# Altium footprint library UWRT Footprint Library.PcbLib: 258 footprints (part 16 of 17)
Each footprint in its own frame and in the unit in brackets; x right, y up, seen from the top. Pads: shape width x height; smd on the part's side, far side on the other; paste and mask are expansions set on the pad; w line width, h text height; cw(c..) or ccw(c..) is an arc to the next point about the centre after c.
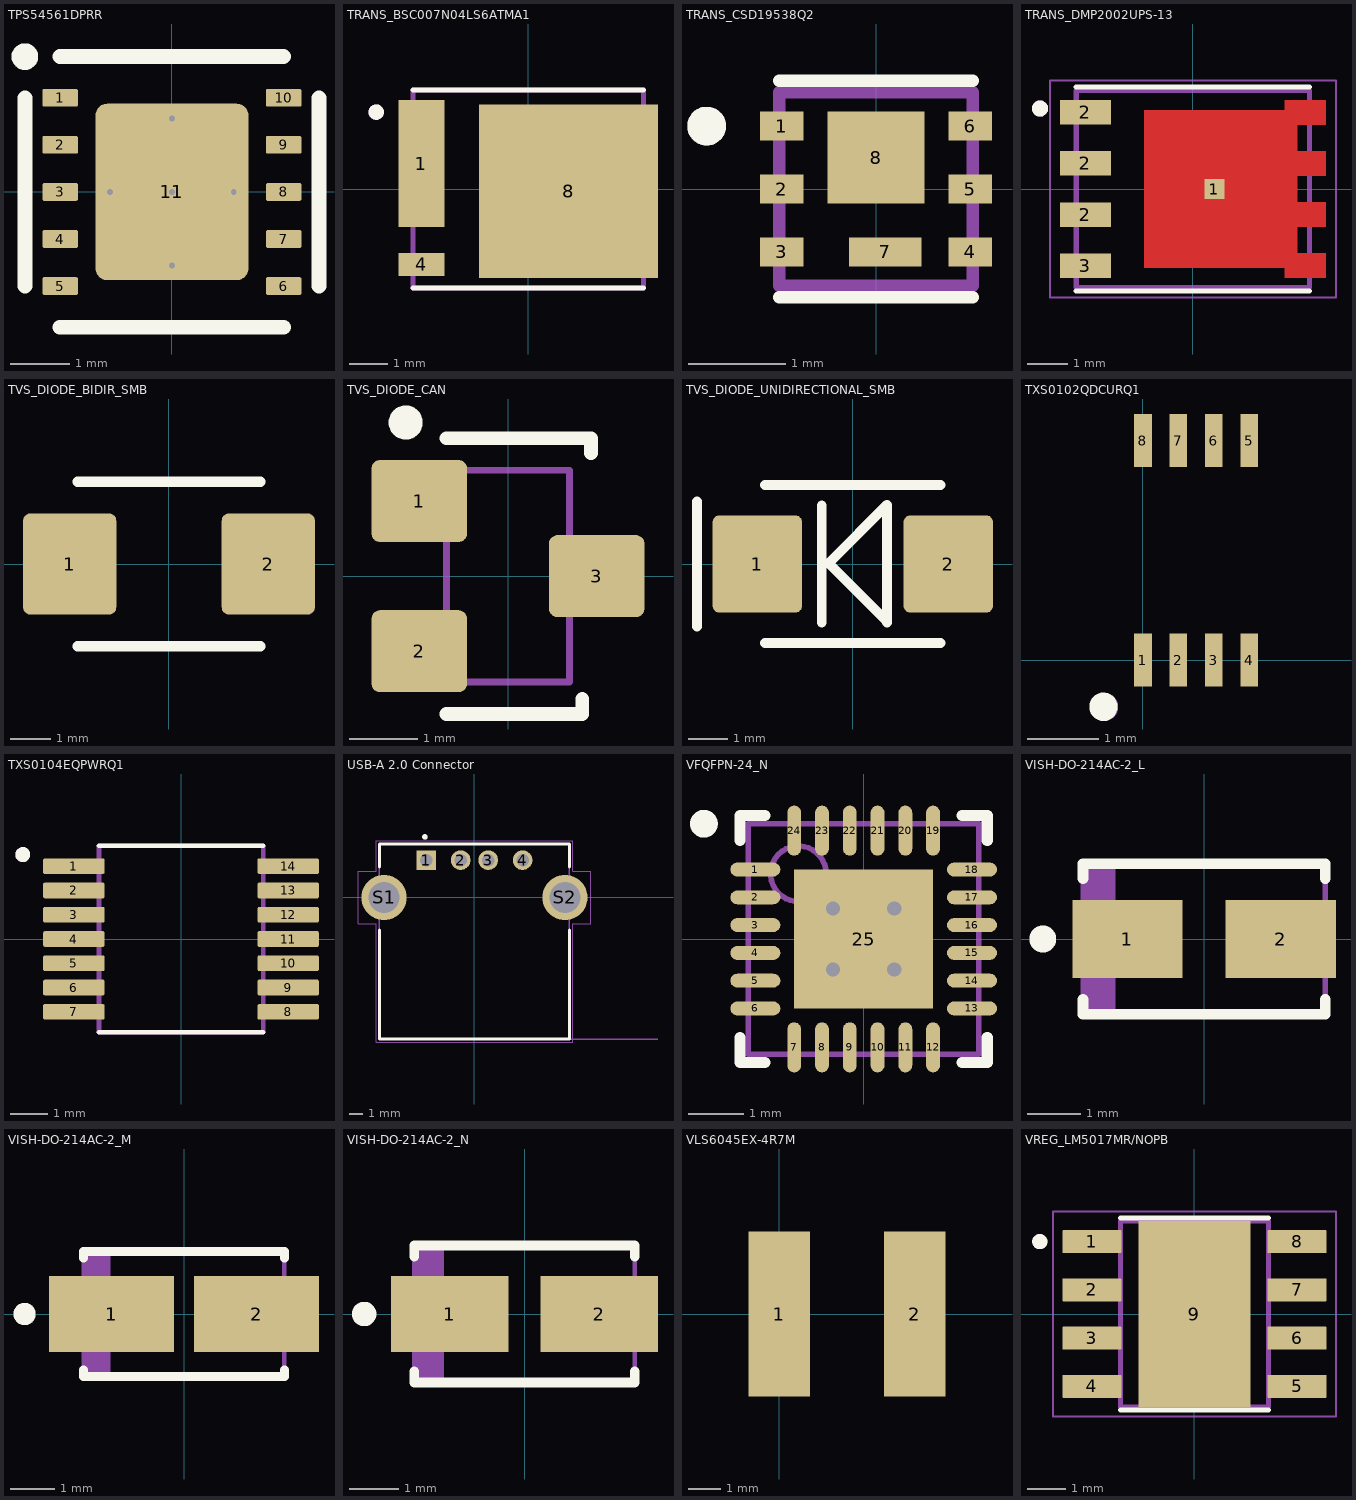
[diagram p15: the footprints below, top view; thin cyan lines are the x and y axes]

## TPS54561DPRR [mm] "Buck Converter"
pads (11):
  rrect15% 0.6x0.3 smd: 1(-1.9,1.6) 2(-1.9,0.8) 3(-1.9,0) 4(-1.9,-0.8) 5(-1.9,-1.6) 6(1.9,-1.6) 7(1.9,-0.8) 8(1.9,0) 9(1.9,0.8) 10(1.9,1.6)
  rrect15% 2.6x3 smd: 11(0,0)
via -1.05,0 diameter 0.2 hole 0.1
via 1.05,0 diameter 0.2 hole 0.1
via 0,-1.25 diameter 0.2 hole 0.1
via 0,1.25 diameter 0.2 hole 0.1
via 0,0 diameter 0.2 hole 0.1
Top Overlay:
  circle w0.254: c-2.5,2.3 r0.1
  lines w0.254: -2.5,-1.6 -2.5,1.6 ; -1.9,-2.3 1.9,-2.3 ; -1.9,2.3 1.9,2.3 ; 2.5,-1.6 2.5,1.6
3D body "TPS54561DPRR.STEP": height 0.8, standoff 0, extent -2,-2 2,2

## TRANS_BSC007N04LS6ATMA1 [mm]
pads (3):
  rect 1.2x3.3 smd paste-3 mask+0: 1(-2.775,0.66)
  rect 1.2x0.6 smd paste-2 mask+0: 4(-2.775,-1.96)
  rect 4.65x4.51 smd paste-3 mask+0: 8(1.05,-0.055)
Top Overlay:
  circle w0.2: c-3.95,2 r0.1
  lines w0.127: -3,-2.575 3,-2.575 ; -3,2.575 3,2.575
Top Paste:
  region: -2.27,-2.163 -2.72,-2.163 -2.72,-1.76 -2.27,-1.76
  region: -2.92,-2.167 -3.27,-2.167 -3.27,-1.76 -2.92,-1.76
  region: -2.92,1.657 -3.27,1.657 -3.27,2.05 -2.92,2.05
  region: -2.92,0.381 -3.27,0.381 -3.27,0.78 -2.92,0.78
  region: -2.92,-0.893 -3.27,-0.893 -3.27,-0.49 -2.92,-0.49
  region: -2.27,-0.891 -2.72,-0.891 -2.72,0.01 -2.27,0.01
  region: -2.27,1.316 -2.72,1.316 -2.72,2.21 -2.27,2.21
  region: -2.27,0.211 -2.72,0.211 -2.72,1.11 -2.27,1.11
  region: 0.55,0.045 -0.95,0.045 -0.95,1.545 0.55,1.545
  region: 2.25,0.045 0.75,0.045 0.75,1.545 2.25,1.545
  region: 0.55,-1.662 -0.95,-1.662 -0.95,-0.155 0.55,-0.155
  region: 2.25,-1.661 0.75,-1.661 0.75,-0.155 2.25,-0.155
  region: 3.28,1.602 2.53,1.602 2.53,2.1 3.28,2.1
  region: 3.28,0.331 2.53,0.331 2.53,0.83 3.28,0.83
  region: 3.28,-0.943 2.53,-0.943 2.53,-0.44 3.28,-0.44
  region: 3.28,-2.212 2.53,-2.212 2.53,-1.71 3.28,-1.71
Top Solder:
  region: 3.325,1.55 2.525,1.55 2.525,0.88 3.325,0.88 3.325,0.28 2.525,0.28 2.525,-0.39 3.325,-0.39 3.325,-0.99 2.525,-0.99 2.525,-1.66 3.325,-1.66 3.325,-2.26 -1.225,-2.26 -1.225,2.15 3.325,2.15
  region: -2.225,-2.21 -3.325,-2.21 -3.325,-1.71 -2.225,-1.71
  region: -2.225,-0.94 -3.325,-0.94 -3.325,-0.44 -2.825,-0.44 -2.825,0.33 -3.325,0.33 -3.325,0.83 -2.825,0.83 -2.825,1.6 -3.325,1.6 -3.325,2.1 -2.825,2.1 -2.825,2.26 -2.225,2.26
Mechanical 13:
  circle w0.2: c-3.95,2 r0.1
  lines w0.127: -3,-2.575 -3,2.575 3,2.575 3,-2.575 -3,-2.575
3D body "User Library-FDMS8018.STEP": height 1.1, standoff 0, extent -2.972,-2.651 3.278,2.549

## TRANS_CSD19538Q2 [mm]
pads (8):
  rect 0.45x0.3 smd mask+0: 1(-0.975,0.65) 2(-0.975,0) 3(-0.975,-0.65) 4(0.975,-0.65) 5(0.975,0) 6(0.975,0.65)
  rect 0.75x0.3 smd paste-1 mask+0: 7(0.095,-0.65)
  rect 1x0.95 smd paste-1 mask+0: 8(0,0.325)
Top Overlay:
  circle w0.2: c-1.75,0.65 r0.1
  lines w0.127: -1,-1.12 1,-1.12 ; -1,1.12 1,1.12
Top Paste:
  region: 0.445,-0.795 -0.255,-0.795 -0.255,-0.505 0.445,-0.505
  region: 0.45,-0.105 -0.45,-0.105 -0.45,0.755 0.45,0.755
Top Solder:
  region: 0.52,-0.85 -0.33,-0.85 -0.33,-0.45 0.52,-0.45
  region: 1.25,0.45 0.7,0.45 0.7,0.85 1.25,0.85
  region: 1.25,-0.2 0.7,-0.2 0.7,0.2 1.25,0.2
  region: 1.25,-0.85 0.7,-0.85 0.7,-0.45 1.25,-0.45
  region: -0.7,-0.85 -1.25,-0.85 -1.25,-0.45 -0.7,-0.45
  region: -0.7,-0.2 -1.25,-0.2 -1.25,0.2 -0.7,0.2
  region: -0.7,0.45 -1.25,0.45 -1.25,0.85 -0.7,0.85
  region: 0.55,-0.2 -0.55,-0.2 -0.55,0.85 0.55,0.85
Mechanical 13:
  circle w0.2: c-1.75,0.65 r0.1
  lines w0.127: -1,-1 1,-1 1,1 -1,1 -1,-1
3D body "CSD19538Q2.STEP": height 0.8, standoff 0, extent -1,-1 1,1

## TRANS_DMP2002UPS-13 [mm]
pads (5):
  rect 0.5x0.5 smd paste-1 mask+0: 1(0.535,0)
  rect 1.27x0.61 smd: 2(-2.67,-0.635) 2(-2.67,0.635) 2(-2.67,1.905) 3(-2.67,-1.905)
Top Layer:
  region: 3.305,1.6 2.595,1.6 2.595,0.94 3.305,0.94 3.305,0.33 2.595,0.33 2.595,-0.33 3.305,-0.33 3.305,-0.94 2.595,-0.94 2.595,-1.6 3.305,-1.6 3.305,-2.21 2.285,-2.21 2.285,-1.955 -1.215,-1.955 -1.215,1.955 2.285,1.955 2.285,2.21 3.305,2.21
Top Overlay:
  circle w0.2: c-3.8,2 r0.1
  lines w0.127: -2.9,-2.53 2.9,-2.53 ; -2.9,2.53 2.9,2.53
Top Paste:
  region: 1.64,-1.235 -0.57,-1.235 -0.57,1.235 1.64,1.235
  region: 3.305,1.6 2.6,1.6 2.6,2.21 3.305,2.21
  region: 3.305,0.33 2.6,0.33 2.6,0.94 3.305,0.94
  region: 3.305,-0.94 2.6,-0.94 2.6,-0.33 3.305,-0.33
  region: 3.305,-2.21 2.6,-2.21 2.6,-1.6 3.305,-1.6
Top Solder:
  region: 3.405,1.5 2.695,1.5 2.695,1.04 3.405,1.04 3.405,0.23 2.695,0.23 2.695,-0.23 3.405,-0.23 3.405,-1.04 2.695,-1.04 2.695,-1.5 3.405,-1.5 3.405,-2.31 2.185,-2.31 2.185,-2.055 -1.315,-2.055 -1.315,2.055 2.185,2.055 2.185,2.31 3.405,2.31
Mechanical 13:
  circle w0.2: c-3.8,2 r0.1
  lines w0.127: -2.9,-2.45 -2.9,2.45 2.9,2.45 2.9,-2.45 -2.9,-2.45
Mechanical 15:
  lines w0.05: -3.555,-2.7 3.555,-2.7 3.555,2.7 -3.555,2.7 -3.555,-2.7
3D body "SOIC8_SG_4P9X3P9MC.step": height 1.75, standoff 0, extent -3.048,-2.451 3.15,2.451

## TVS_DIODE_BIDIR_SMB [mm] "DO-214AA, SMB"
pads (2):
  rrect15% 2.3x2.5 smd: 1(-2.45,0) 2(2.45,0)
Top Overlay:
  lines w0.254: -2.25,-2.032 2.25,-2.032 ; -2.25,2.032 2.25,2.032
3D body "User Library-DO-214AA SMB.STEP": height 2.27, standoff -0.03, extent -2.7,-1.8 2.7,1.8

## TVS_DIODE_CAN [mm] "SOT23, 3-Leads, Body 2.95x2.80mm, Pitch 0.95mm, IPC Low Density"
height 1.25
pads (3):
  rrect20% 1.4x1.2 smd: 1(-1.3,1.1) 2(-1.3,-1.1) 3(1.3,0)
Top Overlay:
  circle w0.25: c-1.5,2.25 r0.125
  lines w0.2: -0.9,-2.02 1.09,-2.02 1.09,-1.8 ; -0.9,2.02 1.217,2.02 1.217,1.8
Mechanical 13:
  lines w0.1: -0.9,-1.55 0.9,-1.55 0.9,1.55 -0.9,1.55 -0.9,-1.55
3D body "User Library-SOT23-3.step": height 1.3, standoff 0, extent -1.4,-1.45 1.4,1.45

## TVS_DIODE_UNIDIRECTIONAL_SMB [mm] "SMBJ26A"
pads (2):
  rrect15% 2.3x2.5 smd: 1(-2.45,0) 2(2.45,0)
Top Overlay:
  lines w0.254: -4,-1.6 -4,1.6 ; -2.25,-2.032 2.25,-2.032 ; -2.25,2.032 2.25,2.032 ; -0.798,-1.5 -0.798,1.5 ; -0.599,0 0.878,-1.476 ; -0.599,0.043 0.878,1.519 ; 0.878,-1.5 0.878,1.5
3D body "User Library-DO-214AA SMB.STEP": height 2.27, standoff -0.03, extent -2.7,-1.8 2.7,1.8

## TXS0102QDCURQ1 [mm]
pads (8):
  rect 0.25x0.75 smd: 1(0,0) 2(0.5,0) 3(1,0) 4(1.5,0) 5(1.5,3.1) 6(1,3.1) 7(0.5,3.1) 8(0,3.1)
Top Overlay:
  circle w0.2: c-0.559,-0.66 r0.1
Mechanical 13:
  circle w0.2: c-0.549,-0.663 r0.1
3D body "8-VSSOP.STEP": height 0.9, standoff 0, extent -0.288,0.102 1.812,3.2

## TXS0104EQPWRQ1 [mm]
pads (14):
  rrect25% 1.65x0.425 smd: 1(-2.87,1.95) 2(-2.87,1.3) 3(-2.87,0.65) 4(-2.87,0) 5(-2.87,-0.65) 6(-2.87,-1.3) 7(-2.87,-1.95) 8(2.87,-1.95) 9(2.87,-1.3) 10(2.87,-0.65) 11(2.87,0) 12(2.87,0.65) 13(2.87,1.3) 14(2.87,1.95)
Top Overlay:
  circle w0.2: c-4.24,2.26 r0.1
  lines w0.127: -2.2,-2.5 2.2,-2.5 ; -2.2,2.5 2.2,2.5
Mechanical 13:
  circle w0.2: c-4.24,2.26 r0.1
  lines w0.127: -2.2,-2.5 2.2,-2.5 2.2,2.5 -2.2,2.5 -2.2,-2.5
3D body "PW0014A.stp": height 1.13, standoff 0, extent -3.2,-2.5 3.2,2.5

## USB-A 2.0 Connector [mm]
pads (6):
  rect 1.428x1.428 hole 0.92: 1(-3.5,2.71)
  round 1.428 hole 0.92: 2(-1,2.71) 3(1,2.71) 4(3.5,2.71)
  round 3.276 hole 2.26: S1(-6.57,0) S2(6.57,0)
Top Overlay:
  circle w0.2: c-3.6,4.4 r0.1
  lines w0.2: -6.9,-2.37 -6.9,-10.28 6.9,-10.28 6.9,-2.37 ; -6.9,2.22 -6.9,3.88 6.9,3.88 6.9,2.22
Mechanical 13:
  circle w0.2: c-3.6,4.4 r0.1
  lines w0.1: 13.33,-10.28 6.9,-10.28 ; 6.9,-10.28 -6.9,-10.28 -6.9,3.88 6.9,3.88 6.9,-10.28
  text "PCB EDGE" at 7.45,-10 h0.81
Mechanical 15:
  lines w0.05: -8.46,-1.9 -8.46,1.9 -7.15,1.9 -7.15,4.13 7.15,4.13 7.15,1.9 8.46,1.9 8.46,-1.9 7.15,-1.9 7.15,-10.53 -7.15,-10.53 -7.15,-1.9 -8.46,-1.9

## VFQFPN-24_N [mm] "QFN, 24-Leads, Body 4x4mm, Pitch 0.5mm, Thermal Pad 2.5x2.5mm, IPC Medium Density"
height 1
pads (25):
  oval 0.9x0.25 smd: 1(-1.95,1.25) 2(-1.95,0.75) 3(-1.95,0.25) 4(-1.95,-0.25) 5(-1.95,-0.75) 6(-1.95,-1.25) 13(1.95,-1.25) 14(1.95,-0.75) 15(1.95,-0.25) 16(1.95,0.25) 17(1.95,0.75) 18(1.95,1.25)
  oval 0.25x0.9 smd: 7(-1.25,-1.95) 8(-0.75,-1.95) 9(-0.25,-1.95) 10(0.25,-1.95) 11(0.75,-1.95) 12(1.25,-1.95) 19(1.25,1.95) 20(0.75,1.95) 21(0.25,1.95) 22(-0.25,1.95) 23(-0.75,1.95) 24(-1.25,1.95)
  rect 2.5x2.5 smd: 25(0,0)
via -0.55,0.55 diameter 0.508 hole 0.254
via 0.55,0.55 diameter 0.508 hole 0.254
via -0.55,-0.55 diameter 0.508 hole 0.254
via 0.55,-0.55 diameter 0.508 hole 0.254
Top Overlay:
  circle w0.25: c-2.875,2.075 r0.125
  lines w0.2: -2.225,-1.775 -2.225,-2.225 -1.775,-2.225 ; -2.225,1.775 -2.225,2.225 -1.775,2.225 ; 1.775,-2.225 2.225,-2.225 2.225,-1.775 ; 1.775,2.225 2.225,2.225 2.225,1.775
Mechanical 13:
  circle w0.1: c-1.175,1.175 r0.5
  lines w0.1: -2.075,-2.075 -2.075,2.075 2.075,2.075 2.075,-2.075 -2.075,-2.075
3D body: height 1, standoff 0, extent -2.075,-2.075 2.075,2.075

## VISH-DO-214AC-2_L [mm] "DO-214AC, 2-Leads, Body 4.5x2.79mm, IPC High Density"
height 2.29
pads (2):
  rect 2.05x1.45 smd: 1(-1.425,0) 2(1.425,0)
Top Overlay:
  circle w0.25: c-3,0 r0.125
  lines w0.2: -2.25,-1.125 -2.25,-1.4 2.25,-1.4 2.25,-1.125 ; -2.25,1.125 -2.25,1.4 2.25,1.4 2.25,1.125
Mechanical 13:
  rectangle: -2.25,-1.395 -1.645,1.395
  lines w0.1: -2.25,-1.395 2.25,-1.395 2.25,1.395 -2.25,1.395 -2.25,-1.395
3D body: height 2.29, standoff 0, extent -2.25,-1.395 2.25,1.395

## VISH-DO-214AC-2_M [mm] "DO-214AC, 2-Leads, Body 4.5x2.79mm, IPC Low Density"
height 2.29
pads (2):
  rect 2.8x1.7 smd: 1(-1.625,0) 2(1.625,0)
Top Overlay:
  circle w0.25: c-3.575,0 r0.125
  lines w0.2: -2.25,-1.25 -2.25,-1.4 2.25,-1.4 2.25,-1.25 ; -2.25,1.25 -2.25,1.4 2.25,1.4 2.25,1.25
Mechanical 13:
  rectangle: -2.25,-1.395 -1.645,1.395
  lines w0.1: -2.25,-1.395 -2.25,1.395 2.25,1.395 2.25,-1.395 -2.25,-1.395
3D body: height 2.29, standoff 0, extent -2.25,-1.395 2.25,1.395

## VISH-DO-214AC-2_N [mm] "DO-214AC, 2-Leads, Body 4.5x2.79mm, IPC Medium Density"
height 2.29
pads (2):
  rect 2.4x1.55 smd: 1(-1.525,0) 2(1.525,0)
Top Overlay:
  circle w0.25: c-3.275,0 r0.125
  lines w0.2: -2.25,-1.175 -2.25,-1.4 2.25,-1.4 2.25,-1.175 ; -2.25,1.175 -2.25,1.4 2.25,1.4 2.25,1.175
Mechanical 13:
  rectangle: -2.25,-1.395 -1.645,1.395
  lines w0.1: -2.25,-1.395 2.25,-1.395 2.25,1.395 -2.25,1.395 -2.25,-1.395
3D body: height 2.29, standoff 0, extent -2.25,-1.395 2.25,1.395

## VLS6045EX-4R7M [mm]
pads (2):
  rect 1.9x5.1 smd: 1(0,0) 2(4.2,0)
3D body "vls6045ex.step": height 4.5, standoff 0, extent -0.968,-3 5.032,3

## VREG_LM5017MR/NOPB [mm]
pads (9):
  rrect5% 1.55x0.6 smd mask+0: 1(-2.7,1.905) 2(-2.7,0.635) 3(-2.7,-0.635) 4(-2.7,-1.905) 5(2.7,-1.905) 6(2.7,-0.635) 7(2.7,0.635) 8(2.7,1.905)
  rect 2.95x4.9 smd paste-3 mask+0: 9(0,0)
Top Overlay:
  circle w0.2: c-4.07,1.905 r0.1
  lines w0.127: -1.95,-2.525 1.95,-2.525 ; -1.95,2.525 1.95,2.525
Top Paste:
  region: 1.355,-1.7 -1.355,-1.7 -1.355,1.7 1.355,1.7
Top Solder:
  drawing of 9 lines, arcs and shapes, not listed
Mechanical 13:
  circle w0.2: c-4.07,1.905 r0.1
  lines w0.127: -1.95,-2.45 1.95,-2.45 1.95,2.45 -1.95,2.45 -1.95,-2.45
Mechanical 15:
  lines w0.05: -3.725,-2.7 3.725,-2.7 3.725,2.7 -3.725,2.7 -3.725,-2.7
3D body "TPS54339DDAR.STEP": height 1.7, standoff 0, extent -3,-2.45 3,2.45